# Altium footprint library AtomlzerPcb.PcbLib: 31 footprints (part 2 of 2)
Each footprint in its own frame and in the unit in brackets; x right, y up, seen from the top. Pads: shape width x height; smd on the part's side, far side on the other; paste and mask are expansions set on the pad; w line width, h text height; cw(c..) or ccw(c..) is an arc to the next point about the centre after c.
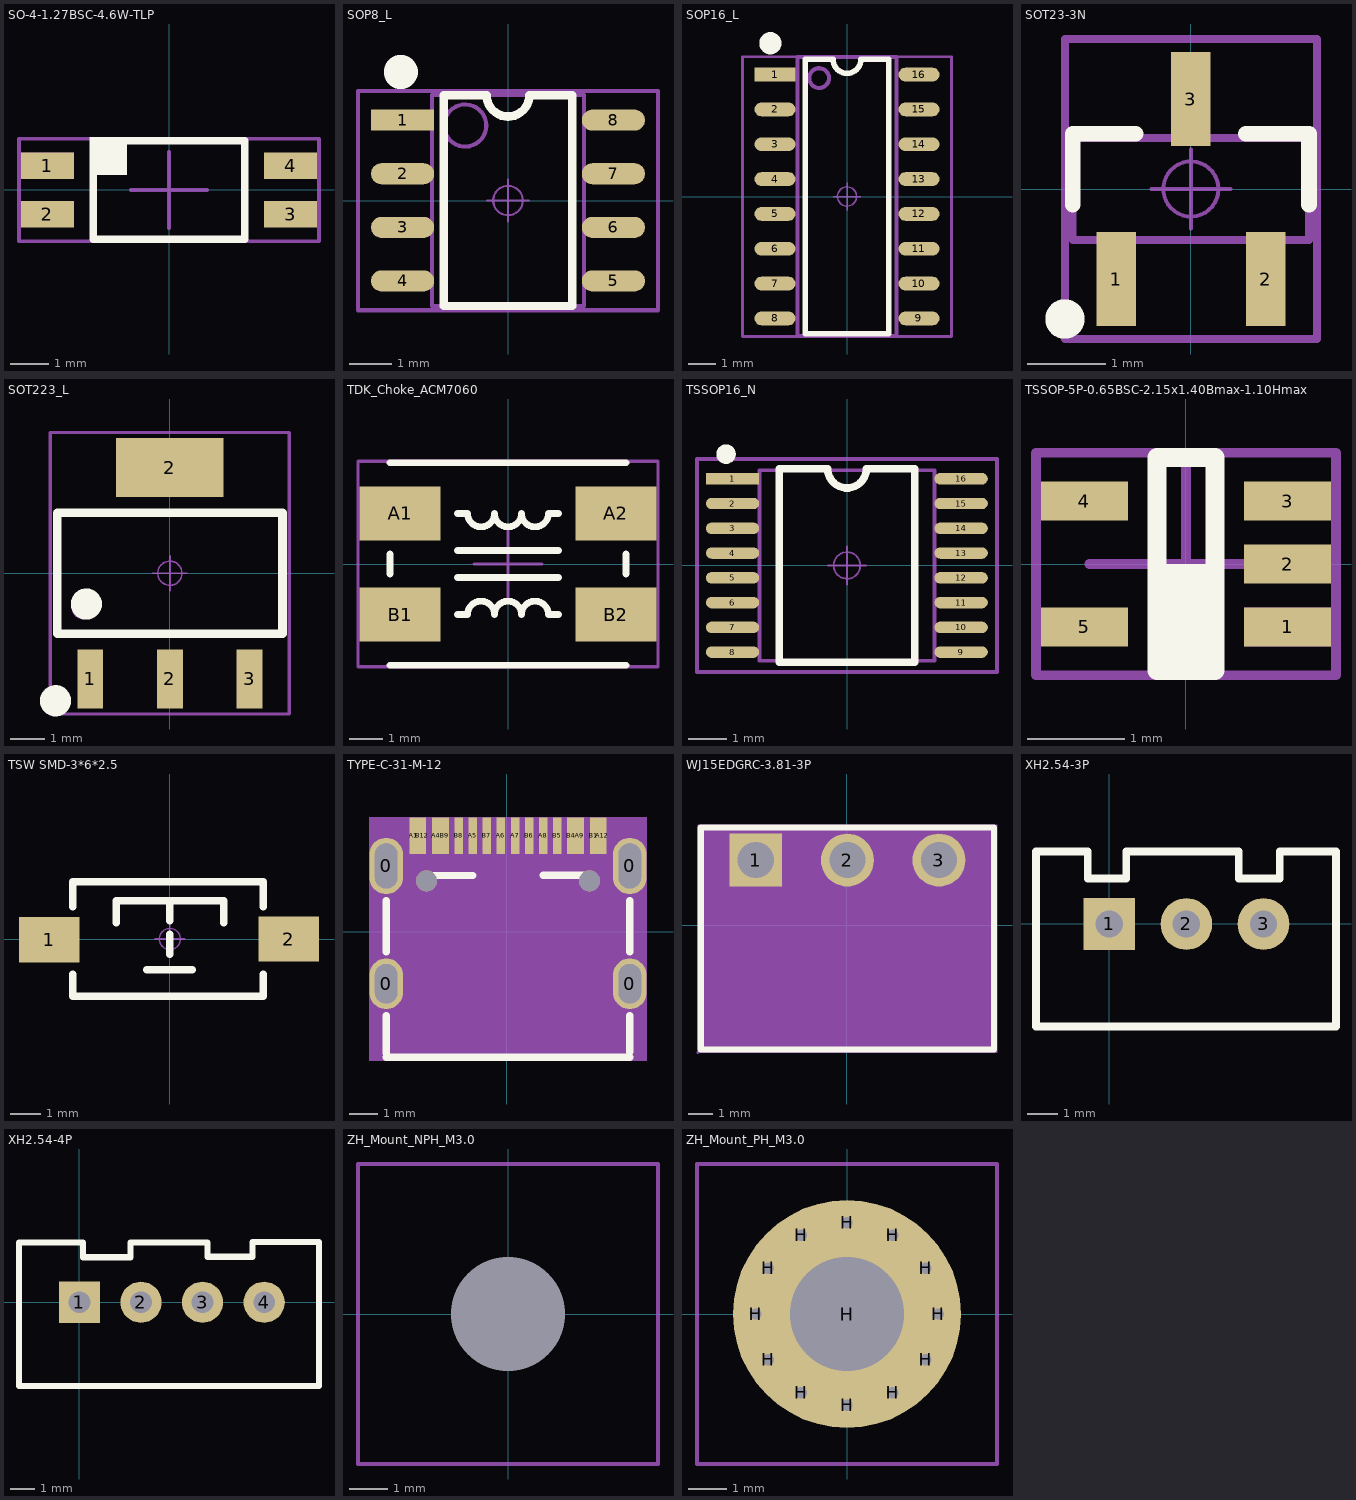
[diagram p1: the footprints below, top view; thin cyan lines are the x and y axes]

## SO-4-1.27BSC-4.6W-TLP [mm]
pads (4):
  rect 1.4x0.7 smd mask+0.05: 1(-3.2,0.635) 2(-3.2,-0.635) 3(3.2,-0.635) 4(3.2,0.635)
Top Overlay:
  rectangle: -2.1,0.4 -1.1,1.4
  lines w0.2: -2,-1.3 -2,1.3 2,1.3 2,-1.3 -2,-1.3
Mechanical 1:
  rectangle: -3.9,0.285 -2.5,0.985
  lines w0.1: -1,0 1,0 ; 0,-1 0,1 ; -3.95,-1.35 3.95,-1.35 3.95,1.35 -3.95,1.35 -3.95,-1.35
3D body "SO-4-1.27BSC-4.6W-TLP.stp": height 2.21, standoff 0, extent -3.5,-1.3 3.5,1.3

## SOP8_L [mm] "5*6*1.8mm（长宽高）"
height 1.75
pads (8):
  rect 1.5x0.5 smd: 1(-2.5,1.905)
  oval 1.5x0.5 smd: 2(-2.5,0.635) 3(-2.5,-0.635) 4(-2.5,-1.905) 5(2.5,-1.905) 6(2.5,-0.635) 7(2.5,0.635) 8(2.5,1.905)
Top Overlay:
  circle w0.5: c-2.54,3.048 r0.155
  lines w0.2: -1.524,2.5 -1.524,-2.5 1.524,-2.5 1.524,2.5
  lines w0.203: -1.524,2.5 -0.508,2.5 ccw(c0,2.5) 0,1.992 ccw(c0,2.5) 0.508,2.5 1.524,2.5
Mechanical 13:
  circle w0.1: c-1.016,1.778 r0.5
  lines w0.1: -1.8,-2.5 -1.8,2.5 1.8,2.5 1.8,-2.5 -1.8,-2.5
Mechanical 15:
  circle w0.05: c0,0 r0.35
  lines w0.05: -0.5,0 0.5,0 ; 0,-0.5 0,0.5
  lines w0.1: -3.556,-2.6 -3.556,2.6 3.556,2.6 3.556,-2.6 -3.556,-2.6
3D body "SOP8.STEP": height 1.9, standoff 0, extent -3.003,-2.5 3.003,2.5

## SOP16_L [mm] "10.3*6.2*1.8mm（长宽高）"
height 1.75
pads (16):
  rect 1.5x0.5 smd: 1(-2.625,4.445)
  oval 1.5x0.5 smd: 2(-2.625,3.175) 3(-2.625,1.905) 4(-2.625,0.635) 5(-2.625,-0.635) 6(-2.625,-1.905) 7(-2.625,-3.175) 8(-2.625,-4.445) 9(2.625,-4.445) 10(2.625,-3.175) 11(2.625,-1.905) 12(2.625,-0.635) 13(2.625,0.635) 14(2.625,1.905) 15(2.625,3.175) 16(2.625,4.445)
Top Overlay:
  circle w0.5: c-2.794,5.588 r0.155
  lines w0.2: -1.524,5 -1.524,-5 1.524,-5 1.524,5
  lines w0.203: -1.524,5 -0.508,5 ccw(c0,5) 0,4.492 ccw(c0,5) 0.508,5 1.524,5
Mechanical 13:
  circle w0.15: c-1.016,4.318 r0.359
  lines w0.15: -1.8,-5.08 -1.8,5.08 1.8,5.08 1.8,-5.08 -1.8,-5.08
Mechanical 15:
  circle w0.05: c0,0 r0.35
  lines w0.05: -0.5,0 0.5,0 ; 0,-0.5 0,0.5
  lines w0.1: -3.81,-5.1 3.81,-5.1 3.81,5.1 -3.81,5.1 -3.81,-5.1
3D body "SOP16.STEP": height 1.9, standoff 0, extent -3.003,-5 3.003,5

## SOT23-3N [mm] "3x1.3x1mm(长宽高)"
height 1.1
pads (3):
  rect 0.5x1.2 smd: 1(-0.95,-1.143) 2(0.95,-1.143) 3(0,1.143)
Top Overlay:
  circle w0.25: c-1.6,-1.651 r0.125
  lines w0.2: -1.501,-0.2 -1.501,0.7 -0.701,0.7 ; 0.699,0.7 1.499,0.7 1.499,-0.2
Mechanical 13:
  lines w0.1: -1.5,-0.65 1.5,-0.65 1.5,0.65 -1.5,0.65 -1.5,-0.65
Mechanical 15:
  circle w0.05: c0,0 r0.35
  lines w0.05: -0.5,0 0.5,0 ; 0,-0.5 0,0.5
  lines w0.1: -1.6,-1.905 1.6,-1.905 1.6,1.905 -1.6,1.905 -1.6,-1.905
3D body "SOT23-3.STEP": height 1.05, standoff 0, extent -1.5,-1.2 1.5,1.2

## SOT223_L [mm] "6.4x7x1.6mm(长宽高)"
height 1.7
pads (4):
  rect 0.75x1.7 smd: 1(-2.3,-3.048) 2(0,-3.048) 3(2.3,-3.048)
  rect 3.1x1.7 smd: 2(0,3.048)
Top Overlay:
  circle w0.5: c-3.302,-3.683 r0.2
  circle w0.5: c-2.413,-0.889 r0.2
  lines w0.25: -3.25,-1.75 3.25,-1.75 3.25,1.75 -3.25,1.75 -3.25,-1.75
Mechanical 13:
  circle w0.1: c-2.536,-1.016 r0.25
  lines w0.1: -3.25,-1.75 3.25,-1.75 3.25,1.75 -3.25,1.75 -3.25,-1.75
Mechanical 15:
  circle w0.05: c0,0 r0.35
  lines w0.05: -0.5,0 0.5,0 ; 0,-0.5 0,0.5
  lines w0.1: -3.45,-4.064 3.45,-4.064 3.45,4.064 -3.45,4.064 -3.45,-4.064
3D body "SOT223.STEP": height 1.65, standoff -0.02, extent -3.25,-3.508 3.25,3.508

## TDK_Choke_ACM7060 [mm]
pads (4):
  rect 2.4x1.6 smd mask+0.05: A1(-3.2,1.5) A2(3.2,1.5) B1(-3.2,-1.5) B2(3.2,-1.5)
Top Overlay:
  lines w0.2: -3.5,-3 3.5,-3 ; -3.5,-0.3 -3.5,0.3 ; -3.5,3 3.5,3 ; -1.5,-1.5 -1.2,-1.5 cw(c-0.8,-1.5) -0.4,-1.5 cw(c0,-1.5) 0.4,-1.5 cw(c0.8,-1.5) 1.2,-1.5 1.5,-1.5 ; -1.5,-0.4 1.5,-0.4 ; -1.5,0.4 1.5,0.4 ; -1.5,1.5 -1.2,1.5 ccw(c-0.8,1.5) -0.4,1.5 ccw(c0,1.5) 0.4,1.5 ccw(c0.8,1.5) 1.2,1.5 1.5,1.5 ; 3.5,-0.3 3.5,0.3
Mechanical 1:
  lines w0.1: -1,0 1,0 ; 0,-1 0,1 ; -4.45,-3.05 -4.45,3.05 4.45,3.05 4.45,-3.05 -4.45,-3.05
3D body "User Library-ACM70V.STEP": height 3.5, standoff 0, extent -3.5,-3 3.5,3

## TSSOP16_N [mm] "5*6.4*1mm（长宽高）"
pads (16):
  rect 1.4x0.3 smd: 1(-3.004,2.275)
  oval 1.4x0.3 smd: 2(-3.004,1.625) 3(-3.004,0.975) 4(-3.004,0.325) 5(-3.004,-0.325) 6(-3.004,-0.975) 7(-3.004,-1.625) 8(-3.004,-2.275) 9(2.996,-2.275) 10(2.996,-1.625) 11(2.996,-0.975) 12(2.996,-0.325) 13(2.996,0.325) 14(2.996,0.975) 15(2.996,1.625) 16(2.996,2.275)
Top Overlay:
  circle w0.254: c-3.175,2.921 r0.13
  lines w0.2: -1.778,-2.54 -1.778,2.54 -0.508,2.54 ccw(c0,2.54) 0.508,2.54 1.778,2.54 1.778,-2.54 -1.778,-2.54
Mechanical 13:
  lines w0.1: -2.3,-2.5 -2.3,2.5 2.3,2.5 2.3,-2.5 -2.3,-2.5
Mechanical 15:
  circle w0.05: c0,0 r0.35
  lines w0.05: -0.5,0 0.5,0 ; 0,-0.5 0,0.5
  lines w0.1: -3.937,-2.794 3.937,-2.794 3.937,2.794 -3.937,2.794 -3.937,-2.794
3D body "TSSOP16.STEP": height 1.03, standoff -0.02, extent -3.202,-2.5 3.202,2.5

## TSSOP-5P-0.65BSC-2.15x1.40Bmax-1.10Hmax [mm]
pads (5):
  rect 0.9x0.4 smd mask+0.05: 1(1.05,-0.65) 2(1.05,0) 3(1.05,0.65) 4(-1.05,0.65) 5(-1.05,-0.65)
Top Overlay:
  rectangle: -0.3,-1 0.3,0
  lines w0.2: -0.3,-1.1 0.3,-1.1 0.3,1.1 -0.3,1.1 -0.3,-1.1
Mechanical 1:
  region: 1.5,-0.45 0.6,-0.45 0.6,-0.85 1.5,-0.85
  lines w0.1: -1,0 1,0 ; 0,-1 0,1 ; -1.55,-1.15 1.55,-1.15 1.55,1.15 -1.55,1.15 -1.55,-1.15
3D body "TSSOP-5P-0.65BSC-2.15x1.40Bmax-1.10Hmax-Pin.step": height 0.5, standoff 0, extent -1.35,0.5 -0.7,0.8
3D body "TSSOP-5P-0.65BSC-2.15x1.40Bmax-1.10Hmax-Pin.step": height 0.5, standoff 0, extent -1.35,-0.8 -0.7,-0.5
3D body "TSSOP-5P-0.65BSC-2.15x1.40Bmax-1.10Hmax-Pin.step": height 0.5, standoff 0, extent 0.7,-0.15 1.35,0.15
3D body "TSSOP-5P-0.65BSC-2.15x1.40Bmax-1.10Hmax-Pin.step": height 0.5, standoff 0, extent 0.7,0.5 1.35,0.8
3D body "TSSOP-5P-0.65BSC-2.15x1.40Bmax-1.10Hmax-Pin.step": height 0.5, standoff 0, extent 0.7,-0.8 1.35,-0.5
3D body "TSSOP-5P-0.65BSC-2.15x1.40Bmax-1.10Hmax-Body.step": height 1.1, standoff 0.1, extent -0.7,-1.075 0.7,1.075

## TSW SMD-3*6*2.5 [mm] "3*6*2.5mm"
pads (2):
  rect 2x1.5 smd: 1(-3.996,-0.02) 2(3.937,0)
Top Overlay:
  lines w0.254: -3.212,-1.168 -3.212,-1.9 3.088,-1.9 3.088,-1.168 ; -3.212,1.067 -3.212,1.9 3.088,1.9 3.088,1.067 ; -1.778,0.533 -1.778,1.27 1.778,1.27 1.778,0.533 ; -0.762,-1.016 0.737,-1.016 ; 0,-0.508 0,0.152 ; 0,0.61 0,1.27
Mechanical 15:
  circle w0.05: c0,0 r0.35
  lines w0.05: -0.5,0 0.5,0 ; 0,-0.5 0,0.5
3D body "TSW SMD-3x6x2.5.STEP": height 2.59, standoff -0.03, extent -4,-1.877 4,1.623

## TYPE-C-31-M-12 [mm]
pads (22):
  oval 1.2x1.8 hole 0.8 slot 1.4 at 90 deg: 0(-4.28,-1.842) 0(4.36,-1.842)
  oval 1.2x2 hole 0.8 slot 1.6 at 90 deg: 0(-4.28,2.338) 0(4.36,2.338)
  rect 0.3x1.3 smd: A1(-3.31,3.405) A4(-2.51,3.405) A5(-1.21,3.405) A6(-0.21,3.405) A7(0.29,3.405) A8(1.29,3.406) A9(2.59,3.405) A12(3.39,3.405) B1(3.09,3.405) B4(2.29,3.405) B5(1.79,3.405) B6(0.79,3.405) B7(-0.71,3.405) B8(-1.71,3.406) B9(-2.21,3.405) B12(-3.01,3.405)
  round 0.75 hole 0.75 unplated: ""(-2.85,1.808) ""(2.93,1.808)
Top Overlay:
  lines w0.254: -4.28,-4.445 4.36,-4.445 ; -4.28,-4.309 -4.28,-2.974 ; -4.28,-0.711 -4.28,1.106 ; -2.96,2.002 -1.21,2.002 ; 1.287,2.005 3.037,2.005 ; 4.36,-4.259 4.36,-2.974 ; 4.36,-0.711 4.36,1.106
Mechanical 4:
  circle w0.375: c-2.85,1.808 r0.187
  circle w0.375: c2.93,1.808 r0.187
  region: -4.88,4.065 4.96,4.065 4.96,-4.572 -4.88,-4.572
Mechanical 5:
  circle w0.127: c-2.85,1.808 r0.375
  circle w0.127: c2.93,1.808 r0.375
  region: -3.46,4.055 -3.16,4.055 -3.16,2.755 -3.46,2.755
  region: -3.16,4.055 -2.86,4.055 -2.86,2.755 -3.16,2.755
  region: -2.66,4.055 -2.36,4.055 -2.36,2.755 -2.66,2.755
  region: -2.36,4.055 -2.06,4.055 -2.06,2.755 -2.36,2.755
  region: -1.86,4.056 -1.56,4.056 -1.56,2.756 -1.86,2.756
  region: -1.36,4.055 -1.06,4.055 -1.06,2.755 -1.36,2.755
  region: -0.86,4.055 -0.56,4.055 -0.56,2.755 -0.86,2.755
  region: -0.36,4.055 -0.06,4.055 -0.06,2.755 -0.36,2.755
  region: 0.14,4.055 0.44,4.055 0.44,2.755 0.14,2.755
  region: 0.64,4.055 0.94,4.055 0.94,2.755 0.64,2.755
  region: 1.14,4.056 1.44,4.056 1.44,2.756 1.14,2.756
  region: 1.64,4.055 1.94,4.055 1.94,2.755 1.64,2.755
  region: 2.14,4.055 2.44,4.055 2.44,2.755 2.14,2.755
  region: 2.44,4.055 2.74,4.055 2.74,2.755 2.44,2.755
  region: 2.94,4.055 3.24,4.055 3.24,2.755 2.94,2.755
  region: 3.24,4.055 3.54,4.055 3.54,2.755 3.24,2.755
  region: -4.88,-0.942 -3.68,-0.942 -3.68,-2.742 -4.88,-2.742
  region: 3.76,-0.942 4.96,-0.942 4.96,-2.742 3.76,-2.742
  region: 3.76,3.338 4.96,3.338 4.96,1.338 3.76,1.338
  region: -4.88,3.338 -3.68,3.338 -3.68,1.338 -4.88,1.338
Mechanical 15:
  lines w0.003: 0.015,0.375 0.065,0.426

## WJ15EDGRC-3.81-3P [mm] "拔插端子-3p"
pads (3):
  rect 2.2x2.2 hole 1.5: 1(-3.78,2.703)
  round 2.2 hole 1.5: 2(0.03,2.703) 3(3.84,2.703)
Top Overlay:
  lines w0.254: -6.066,-5.177 -6.066,3.973 ; -6.066,-5.171 6.126,-5.171 6.126,3.973 ; -6.066,4.053 6.126,4.053
Mechanical 4:
  region: -6.193,4.18 6.253,4.18 6.253,-5.304 -6.193,-5.304
Mechanical 5:
  circle w0.65: c3.84,2.703 r0.325
  circle w0.65: c0.03,2.703 r0.325
  circle w0.65: c-3.78,2.703 r0.325
Mechanical 6:
  circle w0.06: c-6.193,-5.304 r0.03
Mechanical 15:
  lines w0.003: -0.01,-0.166 0.04,-0.115

## XH2.54-3P [mm] "接插件，3P"
pads (3):
  rect 1.7x1.7 hole 0.9: 1(0,0)
  round 1.7 hole 0.9: 2(2.54,0) 3(5.08,0)
Top Overlay:
  lines w0.254: -2.413,-3.378 -2.413,2.388 -0.711,2.388 -0.711,1.5 0.559,1.5 0.559,2.388 4.267,2.388 4.267,1.5 5.613,1.5 5.613,2.388 7.468,2.388 7.468,-3.378 -2.413,-3.378
3D body "XH2.54-3P.STEP": height 7.03, standoff -2.47, extent -2.5,-3.3 7.58,2.4

## XH2.54-4P [mm] "接插件，4P"
pads (4):
  rect 1.7x1.7 hole 0.9: 1(0,0)
  round 1.7 hole 0.9: 2(2.54,0) 3(5.08,0) 4(7.62,0)
Top Overlay:
  lines w0.254: -2.489,-3.454 9.881,-3.454 9.881,2.489 7.137,2.489 7.137,1.88 5.283,1.88 5.283,2.464 2.108,2.464 2.108,1.854 0.152,1.854 0.152,2.464 -2.489,2.464 -2.489,-3.454
3D body "XH2.54-4P.STEP": height 7.03, standoff -2.47, extent -2.5,-3.3 10.12,2.4

## ZH_Mount_NPH_M3.0 [mm]
pads (1):
  round 2.8 hole 3 unplated mask+0.05: ""(0,0)
Mechanical 1:
  lines w0.1: -1,0 1,0 ; 0,-1 0,1 ; -3.95,-3.95 -3.95,3.95 3.95,3.95 3.95,-3.95 -3.95,-3.95
3D body: height 0, standoff -4, extent -1.24,-1.247 1.25,1.248
3D body: height 3, standoff 0, extent -2.9,-2.897 2.9,2.897

## ZH_Mount_PH_M3.0 [mm]
pads (13):
  round 0.6 hole 0.3 mask+0.05: H(-2.4,0) H(-2.078,-1.2) H(-2.078,1.2) H(-1.2,-2.078) H(-1.2,2.078) H(0,-2.4) H(0,2.4) H(1.2,-2.078) H(1.2,2.078) H(2.078,-1.2) H(2.078,1.2) H(2.4,0)
  round 6 hole 3 mask+0.05: H(0,0)
Mechanical 1:
  lines w0.1: -1,0 1,0 ; 0,-1 0,1 ; -3.95,-3.95 -3.95,3.95 3.95,3.95 3.95,-3.95 -3.95,-3.95
3D body: height 0, standoff -4, extent -1.24,-1.247 1.25,1.248
3D body: height 3, standoff 0, extent -2.9,-2.897 2.9,2.897